# Altium footprint library IC_SMD_QUAD.PCBLIB: 78 footprints (part 3 of 5)
Each footprint in its own frame and in the unit in brackets; x right, y up, seen from the top. Pads: shape width x height; smd on the part's side, far side on the other; paste and mask are expansions set on the pad; w line width, h text height; cw(c..) or ccw(c..) is an arc to the next point about the centre after c.
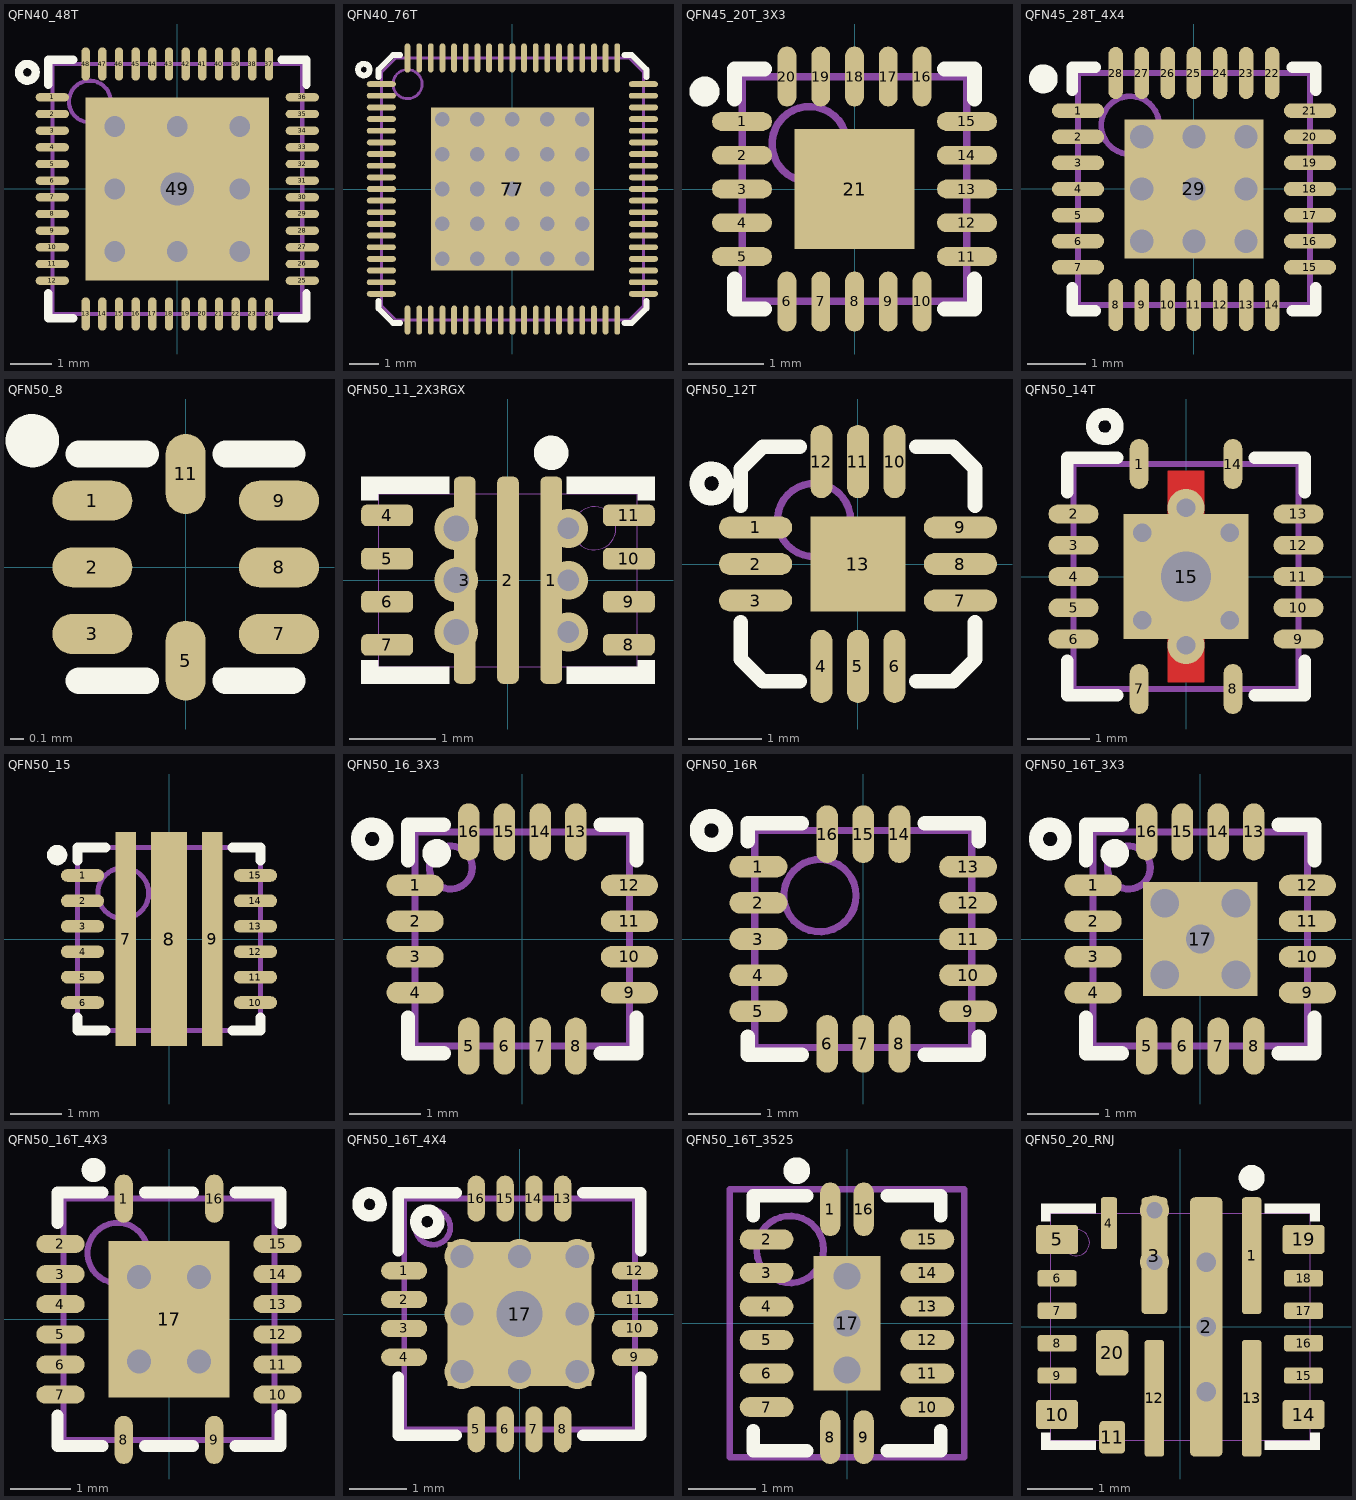
[diagram p2: the footprints below, top view; thin cyan lines are the x and y axes]

## QFN40_48T [mm] "QFN, 48-Leads, Body 6.00x6.00mm, Pitch 0.40mm, Thermal Pad 4.40x4.40mm"
height 1
pads (49):
  oval 0.8x0.2 smd mask+0.075: 1(-3,2.2) 2(-3,1.8) 3(-3,1.4) 4(-3,1) 5(-3,0.6) 6(-3,0.2) 7(-3,-0.2) 8(-3,-0.6) 9(-3,-1) 10(-3,-1.4) 11(-3,-1.8) 12(-3,-2.2) 25(3,-2.2) 26(3,-1.8) 27(3,-1.4) 28(3,-1) 29(3,-0.6) 30(3,-0.2) 31(3,0.2) 32(3,0.6) 33(3,1) 34(3,1.4) 35(3,1.8) 36(3,2.2)
  oval 0.2x0.8 smd mask+0.075: 13(-2.2,-3) 14(-1.8,-3) 15(-1.4,-3) 16(-1,-3) 17(-0.6,-3) 18(-0.2,-3) 19(0.2,-3) 20(0.6,-3) 21(1,-3) 22(1.4,-3) 23(1.8,-3) 24(2.2,-3) 37(2.2,3) 38(1.8,3) 39(1.4,3) 40(1,3) 41(0.6,3) 42(0.2,3) 43(-0.2,3) 44(-0.6,3) 45(-1,3) 46(-1.4,3) 47(-1.8,3) 48(-2.2,3)
  rect 4.4x4.4 smd mask+0.1: 49(0,0)
via 0,0 diameter 1.2 hole 0.8
via 0,1.5 diameter 0.8 hole 0.5
via -1.5,0 diameter 0.8 hole 0.5
via 0,-1.5 diameter 0.8 hole 0.5
via 1.5,0 diameter 0.8 hole 0.5
via 1.5,1.5 diameter 0.8 hole 0.5
via -1.5,1.5 diameter 0.8 hole 0.5
via -1.5,-1.5 diameter 0.8 hole 0.5
via 1.5,-1.5 diameter 0.8 hole 0.5
TopOverlay:
  circle w0.2: c-3.6,2.8 r0.2
  lines w0.2: -3.1,-2.5 -3.1,-3.1 -2.5,-3.1 ; -3.1,2.5 -3.1,3.1 -2.5,3.1 ; 2.5,-3.1 3.1,-3.1 3.1,-2.5 ; 2.5,3.1 3.1,3.1 3.1,2.5
Mechanical13:
  circle w0.1: c-2.1,2.1 r0.5
  lines w0.1: -3,-3 -3,3 3,3 3,-3 -3,-3
3D body: height 1, standoff 0, extent -3,-3 3,3

## QFN40_76T [mm] "QFN, 76-Leads, Body 9.00x9.00mm, Pitch 0.40mm, Thermal Pad 5.50x5.50mm"
height 1
pads (77):
  oval 1x0.2 smd mask+0.05: 1(-4.5,3.6) 2(-4.5,3.2) 3(-4.5,2.8) 4(-4.5,2.4) 5(-4.5,2) 6(-4.5,1.6) 7(-4.5,1.2) 8(-4.5,0.8) 9(-4.5,0.4) 10(-4.5,0) 11(-4.5,-0.4) 12(-4.5,-0.8) 13(-4.5,-1.2) 14(-4.5,-1.6) 15(-4.5,-2) 16(-4.5,-2.4) 17(-4.5,-2.8) 18(-4.5,-3.2) 19(-4.5,-3.6) 39(4.5,-3.6) 40(4.5,-3.2) 41(4.5,-2.8) 42(4.5,-2.4) 43(4.5,-2) 44(4.5,-1.6) 45(4.5,-1.2) 46(4.5,-0.8) 47(4.5,-0.4) 48(4.5,0) 49(4.5,0.4) 50(4.5,0.8) 51(4.5,1.2) 52(4.5,1.6) 53(4.5,2) 54(4.5,2.4) 55(4.5,2.8) 56(4.5,3.2) 57(4.5,3.6)
  oval 0.2x1 smd mask+0.05: 20(-3.6,-4.5) 21(-3.2,-4.5) 22(-2.8,-4.5) 23(-2.4,-4.5) 24(-2,-4.5) 25(-1.6,-4.5) 26(-1.2,-4.5) 27(-0.8,-4.5) 28(-0.4,-4.5) 29(0,-4.5) 30(0.4,-4.5) 31(0.8,-4.5) 32(1.2,-4.5) 33(1.6,-4.5) 34(2,-4.5) 35(2.4,-4.5) 36(2.8,-4.5) 37(3.2,-4.5) 38(3.6,-4.5) 58(3.6,4.5) 59(3.2,4.5) 60(2.8,4.5) 61(2.4,4.5) 62(2,4.5) 63(1.6,4.5) 64(1.2,4.5) 65(0.8,4.5) 66(0.4,4.5) 67(0,4.5) 68(-0.4,4.5) 69(-0.8,4.5) 70(-1.2,4.5) 71(-1.6,4.5) 72(-2,4.5) 73(-2.4,4.5) 74(-2.8,4.5) 75(-3.2,4.5) 76(-3.6,4.5)
  rect 5.6x5.6 smd: 77(0,0)
via -2.4,2.4 diameter 0.8 hole 0.5
via -1.2,2.4 diameter 0.8 hole 0.5
via -2.4,1.2 diameter 0.8 hole 0.5
via 0,2.4 diameter 0.8 hole 0.5
via 1.2,2.4 diameter 0.8 hole 0.5
via 2.4,2.4 diameter 0.8 hole 0.5
via -1.2,1.2 diameter 0.8 hole 0.5
via 0,1.2 diameter 0.8 hole 0.5
via 1.2,1.2 diameter 0.8 hole 0.5
via 2.4,1.2 diameter 0.8 hole 0.5
via -1.2,0 diameter 0.8 hole 0.5
via -1.2,-1.2 diameter 0.8 hole 0.5
via -2.4,0 diameter 0.8 hole 0.5
via -1.2,-2.4 diameter 0.8 hole 0.5
via -2.4,-1.2 diameter 0.8 hole 0.5
via -2.4,-2.4 diameter 0.8 hole 0.5
via 1.2,0 diameter 0.8 hole 0.5
via 1.2,-1.2 diameter 0.8 hole 0.5
via 0,0 diameter 0.8 hole 0.5
via 1.2,-2.4 diameter 0.8 hole 0.5
via 0,-1.2 diameter 0.8 hole 0.5
via 0,-2.4 diameter 0.8 hole 0.5
via 2.4,0 diameter 0.8 hole 0.5
via 2.4,-1.2 diameter 0.8 hole 0.5
via 2.4,-2.4 diameter 0.8 hole 0.5
TopOverlay:
  circle w0.2: c-5.1,4.1 r0.2
  lines w0.2: -4.6,-3.85 -4.6,-4.1 -4.1,-4.6 -3.85,-4.6 ; -4.6,3.85 -4.6,4.1 -4.1,4.6 -3.85,4.6 ; 3.85,-4.6 4.1,-4.6 4.6,-4.1 4.6,-3.85 ; 3.85,4.6 4.1,4.6 4.6,4.1 4.6,3.85
Mechanical13:
  circle w0.1: c-3.6,3.6 r0.5
  lines w0.1: -4.5,-4 -4,-4.5 4,-4.5 4.5,-4 4.5,4 4,4.5 -4,4.5 -4.5,4 -4.5,-4
3D body: height 1, standoff 0, extent -4.5,-4.5 4.5,4.5

## QFN45_20T_3X3 [mm] "20M2, QFN-20, 3X3mm, pitch 0.45mm"
height 0.8
pads (21):
  oval 0.8x0.25 smd mask+0.05: 1(-1.5,0.9) 2(-1.5,0.45) 3(-1.5,0) 4(-1.5,-0.45) 5(-1.5,-0.9) 11(1.5,-0.9) 12(1.5,-0.45) 13(1.5,0) 14(1.5,0.45) 15(1.5,0.9)
  oval 0.25x0.8 smd mask+0.05: 6(-0.9,-1.5) 7(-0.45,-1.5) 8(0,-1.5) 9(0.45,-1.5) 10(0.9,-1.5) 16(0.9,1.5) 17(0.45,1.5) 18(0,1.5) 19(-0.45,1.5) 20(-0.9,1.5)
  rect 1.6x1.6 smd mask+0.1: 21(0,0)
TopOverlay:
  circle w0.2: c-2,1.3 r0.1
  lines w0.2: -1.6,-1.2 -1.6,-1.6 -1.2,-1.6 ; -1.6,1.2 -1.6,1.6 -1.2,1.6 ; 1.2,-1.6 1.6,-1.6 1.6,-1.2 ; 1.2,1.6 1.6,1.6 1.6,1.2
Mechanical13:
  circle w0.1: c-0.6,0.6 r0.5
  lines w0.1: -1.5,-1.5 1.5,-1.5 1.5,1.5 -1.5,1.5 -1.5,-1.5
3D body "QFN45_20T_3X3.step": height 0.8, standoff 0, extent -1.501,-1.501 1.501,1.501

## QFN45_28T_4X4 [mm] "28M1, QFN-28, pitch:0.45mm 4x4x1mm"
height 1
pads (29):
  oval 0.9x0.25 smd mask+0.05: 1(-2,1.35) 2(-2,0.9) 3(-2,0.45) 4(-2,0) 5(-2,-0.45) 6(-2,-0.9) 7(-2,-1.35) 15(2,-1.35) 16(2,-0.9) 17(2,-0.45) 18(2,0) 19(2,0.45) 20(2,0.9) 21(2,1.35)
  oval 0.25x0.9 smd mask+0.05: 8(-1.35,-2) 9(-0.9,-2) 10(-0.45,-2) 11(0,-2) 12(0.45,-2) 13(0.9,-2) 14(1.35,-2) 22(1.35,2) 23(0.9,2) 24(0.45,2) 25(0,2) 26(-0.45,2) 27(-0.9,2) 28(-1.35,2)
  rect 2.4x2.4 smd: 29(0,0)
via 0,0 diameter 0.6 hole 0.4
via 0,0.9 diameter 0.6 hole 0.4
via 0,-0.9 diameter 0.6 hole 0.4
via 0.9,0 diameter 0.6 hole 0.4
via -0.9,0 diameter 0.6 hole 0.4
via -0.9,0.9 diameter 0.6 hole 0.4
via 0.9,0.9 diameter 0.6 hole 0.4
via -0.9,-0.9 diameter 0.6 hole 0.4
via 0.9,-0.9 diameter 0.6 hole 0.4
TopOverlay:
  circle w0.25: c-2.6,1.9 r0.125
  lines w0.2: -2.1,-1.7 -2.1,-2.1 -1.7,-2.1 ; -2.1,1.7 -2.1,2.1 -1.7,2.1 ; 1.7,-2.1 2.1,-2.1 2.1,-1.7 ; 1.7,2.1 2.1,2.1 2.1,1.7
Mechanical13:
  circle w0.1: c-1.1,1.1 r0.5
  lines w0.1: -2,-2 -2,2 2,2 2,-2 -2,-2
3D body "QFN45_28T_4X4.step": height 1, standoff 0, extent -2.001,-2.001 2.001,2.001

## QFN50_8 [mm] "RSE UQFN-8, 1.5X1.5X.6mm"
height 0.6
pads (8):
  oval 0.6x0.3 smd mask+0.05: 1(-0.7,0.5) 2(-0.7,0) 3(-0.7,-0.5) 7(0.7,-0.5) 8(0.7,0) 9(0.7,0.5)
  oval 0.3x0.6 smd mask+0.05: 5(0,-0.7) 11(0,0.7)
TopOverlay:
  circle w0.2: c-1.15,0.95 r0.1
  lines w0.2: -0.8,-0.85 -0.3,-0.85 ; -0.8,0.85 -0.3,0.85 ; 0.3,-0.85 0.8,-0.85 ; 0.3,0.85 0.8,0.85
3D body: height 0.6, standoff 0, extent -0.75,-0.75 0.75,0.75

## QFN50_11_2X3RGX [mm] "QFN-11 RGX, pitch: 0.5mm, 2x3x1mm"
height 1
pads (11):
  rrect50% 0.25x2.4 smd mask+0.05: 1(0.5,0) 2(0,0) 3(-0.5,0)
  rrect50% 0.6x0.25 smd mask+0.05: 4(-1.4,0.75) 5(-1.4,0.25) 6(-1.4,-0.25) 7(-1.4,-0.75) 8(1.4,-0.75) 9(1.4,-0.25) 10(1.4,0.25) 11(1.4,0.75)
via -0.6,0 diameter 0.5 hole 0.3
via -0.6,0.6 diameter 0.5 hole 0.3
via -0.6,-0.6 diameter 0.5 hole 0.3
via 0.7,-0.6 diameter 0.45 hole 0.25
via 0.7,0.6 diameter 0.45 hole 0.25
via 0.7,0 diameter 0.45 hole 0.25
TopOverlay:
  circle w0.2: c0.5,1.475 r0.1
  rectangle: 0.675,-1.2 1.7,-1
  region: 1.5,-0.925 1.5,-1.2 1.7,-1.2 1.7,-0.925
  region: -0.675,-1 -1.7,-1 -1.7,-1.2 -0.675,-1.2
  region: -1.7,-0.925 -1.7,-1.2 -1.5,-1.2 -1.5,-0.925
  region: -0.675,1.2 -1.7,1.2 -1.7,1 -0.675,1
  region: -1.5,0.925 -1.5,1.2 -1.7,1.2 -1.7,0.925
  region: 1.7,0.925 1.7,1.2 1.5,1.2 1.5,0.925
  rectangle: 0.675,1 1.7,1.2
TopPaste:
  drawing of 9 lines, arcs and shapes, not listed
Mechanical13:
  circle w0.01: c1,0.6 r0.25
  lines w0.01: -1.5,-1 -1.5,1 1.5,1 1.5,-1 -1.5,-1
3D body "RGX0011A.stp": height 1, standoff 0, extent -1.5,-1 1.5,1

## QFN50_12T [mm] "LFCSP, CP-12-4, 3X3mm, 0.5mm pitch, MO-220"
height 0.8
pads (13):
  oval 1x0.3 smd mask+0.05: 1(-1.4,0.5) 2(-1.4,0) 3(-1.4,-0.5) 7(1.4,-0.5) 8(1.4,0) 9(1.4,0.5)
  oval 0.3x1 smd mask+0.05: 4(-0.5,-1.4) 5(0,-1.4) 6(0.5,-1.4) 10(0.5,1.4) 11(0,1.4) 12(-0.5,1.4)
  rect 1.3x1.3 smd mask+0.075: 13(0,0)
TopOverlay:
  circle w0.2: c-2,1.1 r0.2
  lines w0.2: -1.6,-0.8 -1.6,-1.3 -1.3,-1.6 -0.8,-1.6 ; -1.6,0.8 -1.6,1.3 -1.3,1.6 -0.8,1.6 ; 0.8,-1.6 1.3,-1.6 1.6,-1.3 1.6,-0.8 ; 0.8,1.6 1.3,1.6 1.6,1.3 1.6,0.8
Mechanical13:
  circle w0.1: c-0.6,0.6 r0.5
3D body "User Library-LFCSP.STEP": height 0.85, standoff 0, extent -1.525,-1.525 1.525,1.525

## QFN50_14T [mm] "S-PVQFN-N14, 3.5X3.5mm, pitch: 0.5mm, 6+2+6+2"
pads (15):
  oval 0.3x0.8 smd mask+0.075: 1(-0.75,1.8) 7(-0.75,-1.8) 8(0.75,-1.8) 14(0.75,1.8)
  oval 0.8x0.3 smd mask+0.075: 2(-1.8,1) 3(-1.8,0.5) 4(-1.8,0) 5(-1.8,-0.5) 6(-1.8,-1) 9(1.8,-1) 10(1.8,-0.5) 11(1.8,0) 12(1.8,0.5) 13(1.8,1)
  rect 2x2 smd mask+0.1: 15(0,0)
via 0,0 diameter 1.2 hole 0.8
via -0.7,0.7 diameter 0.6 hole 0.3
via 0.7,0.7 diameter 0.6 hole 0.3
via 0.7,-0.7 diameter 0.6 hole 0.3
via -0.7,-0.7 diameter 0.6 hole 0.3
via 0,-1.1 diameter 0.6 hole 0.3
via 0,1.1 diameter 0.6 hole 0.3
TopLayer:
  rectangle: -0.3,-1.7 0.3,1.7
TopOverlay:
  circle w0.2: c-1.3,2.4 r0.2
  lines w0.2: -1.9,-1.35 -1.9,-1.9 -1.1,-1.9 ; -1.9,1.35 -1.9,1.9 -1.1,1.9 ; 1.1,-1.9 1.9,-1.9 1.9,-1.35 ; 1.1,1.9 1.9,1.9 1.9,1.35
TopSolder:
  rectangle: -0.4,-1.8 0.4,1.8
Mechanical13:
  lines w0.1: -1.8,-1.8 1.8,-1.8 1.8,1.8 -1.8,1.8 -1.8,-1.8
3D body: height 1, standoff 0, extent -1.8,-1.8 1.8,1.8

## QFN50_15 [mm] "PVQFN-N15"
pads (15):
  oval 0.85x0.25 smd mask+0.075: 1(-1.7,1.25) 2(-1.7,0.75) 3(-1.7,0.25) 4(-1.7,-0.25) 5(-1.7,-0.75) 6(-1.7,-1.25) 10(1.7,-1.25) 11(1.7,-0.75) 12(1.7,-0.25) 13(1.7,0.25) 14(1.7,0.75) 15(1.7,1.25)
  rect 0.4x4.2 smd paste-1.8 mask+0.075: 7(-0.85,0) 9(0.85,0)
  rect 0.7x4.2 smd paste-1.8 mask+0.075: 8(0,0)
TopOverlay:
  circle w0.2: c-2.2,1.65 r0.1
  lines w0.2: -1.8,-1.55 -1.8,-1.8 -1.25,-1.8 ; -1.8,1.55 -1.8,1.8 -1.25,1.8 ; 1.25,-1.8 1.8,-1.8 1.8,-1.55 ; 1.25,1.8 1.8,1.8 1.8,1.55
TopPaste:
  rectangle: -1.05,1.3 -0.65,2.1
  rectangle: -1.05,-2.1 -0.65,-1.3
  rectangle: -1.05,0.2 -0.65,1
  rectangle: -1.05,-1 -0.65,-0.2
  region: 1.05,-0.2 0.65,-0.2 0.65,-1 1.05,-1
  region: 1.05,1 0.65,1 0.65,0.2 1.05,0.2
  region: 1.05,-1.3 0.65,-1.3 0.65,-2.1 1.05,-2.1
  region: 1.05,2.1 0.65,2.1 0.65,1.3 1.05,1.3
  rectangle: -0.3,-1 0.3,-0.2
  rectangle: -0.3,0.2 0.3,1
  rectangle: -0.3,-2.1 0.3,-1.3
  rectangle: -0.3,1.3 0.3,2.1
Mechanical13:
  circle w0.1: c-0.9,0.9 r0.5
  lines w0.1: -1.8,-1.8 -1.8,1.8 1.8,1.8 1.8,-1.8 -1.8,-1.8
3D body "QFN50_155.step": height 1.03, standoff 0.02, extent -1.801,-1.8 1.801,1.8

## QFN50_16_3X3 [mm] "LPCC, RGT, 16-lead, pitch: 0.5mm, 3x3mm"
height 1
pads (16):
  oval 0.8x0.3 smd mask+0.075: 1(-1.5,0.75) 2(-1.5,0.25) 3(-1.5,-0.25) 4(-1.5,-0.75) 9(1.5,-0.75) 10(1.5,-0.25) 11(1.5,0.25) 12(1.5,0.75)
  oval 0.3x0.8 smd mask+0.075: 5(-0.75,-1.5) 6(-0.25,-1.5) 7(0.25,-1.5) 8(0.75,-1.5) 13(0.75,1.5) 14(0.25,1.5) 15(-0.25,1.5) 16(-0.75,1.5)
TopOverlay:
  circle w0.2: c-2.1,1.4 r0.2
  circle w0.2: c-1.2,1.2 r0.1
  lines w0.2: -1.6,-1.1 -1.6,-1.6 -1.1,-1.6 ; -1.6,1.1 -1.6,1.6 -1.1,1.6 ; 1.1,-1.6 1.6,-1.6 1.6,-1.1 ; 1.1,1.6 1.6,1.6 1.6,1.1
Mechanical13:
  circle w0.1: c-1,1 r0.3
  lines w0.1: -1.5,-1.5 -1.5,1.5 1.5,1.5 1.5,-1.5 -1.5,-1.5
3D body: height 1, standoff 0, extent -1.5,-1.5 1.5,1.5

## QFN50_16R [mm] "MMA8451Q (FREESCALE) 5+3+5+3, 3X3mm, 0.5mm"
height 1
pads (16):
  oval 0.8x0.3 smd mask+0.075: 1(-1.45,1) 2(-1.45,0.5) 3(-1.45,0) 4(-1.45,-0.5) 5(-1.45,-1) 9(1.45,-1) 10(1.45,-0.5) 11(1.45,0) 12(1.45,0.5) 13(1.45,1)
  oval 0.3x0.8 smd mask+0.075: 6(-0.5,-1.45) 7(0,-1.45) 8(0.5,-1.45) 14(0.5,1.45) 15(0,1.45) 16(-0.5,1.45)
TopOverlay:
  circle w0.2: c-2.1,1.5 r0.2
  lines w0.2: -1.6,-1.35 -1.6,-1.6 -0.85,-1.6 ; -1.6,1.35 -1.6,1.6 -0.85,1.6 ; 0.85,-1.6 1.6,-1.6 1.6,-1.35 ; 0.85,1.6 1.6,1.6 1.6,1.35
Mechanical13:
  circle w0.1: c-0.6,0.6 r0.5
  lines w0.1: -1.5,-1.5 1.5,-1.5 1.5,1.5 -1.5,1.5 -1.5,-1.5
3D body: height 1, standoff 0, extent -1.5,-1.5 1.5,1.5

## QFN50_16T_3X3 [mm] "RGT PVQFN (TI), 16-lead, pitch: 0.5mm, 3x3mm"
height 1
pads (17):
  oval 0.8x0.3 smd mask+0.075: 1(-1.5,0.75) 2(-1.5,0.25) 3(-1.5,-0.25) 4(-1.5,-0.75) 9(1.5,-0.75) 10(1.5,-0.25) 11(1.5,0.25) 12(1.5,0.75)
  oval 0.3x0.8 smd mask+0.075: 5(-0.75,-1.5) 6(-0.25,-1.5) 7(0.25,-1.5) 8(0.75,-1.5) 13(0.75,1.5) 14(0.25,1.5) 15(-0.25,1.5) 16(-0.75,1.5)
  rect 1.6x1.6 smd mask+0.1: 17(0,0)
via 0.5,0.5 diameter 0.6 hole 0.4
via 0.5,-0.5 diameter 0.6 hole 0.4
via -0.5,-0.5 diameter 0.6 hole 0.4
via -0.5,0.5 diameter 0.6 hole 0.4
via 0,0 diameter 0.6 hole 0.4
TopOverlay:
  circle w0.2: c-2.1,1.4 r0.2
  circle w0.2: c-1.2,1.2 r0.1
  lines w0.2: -1.6,-1.1 -1.6,-1.6 -1.1,-1.6 ; -1.6,1.1 -1.6,1.6 -1.1,1.6 ; 1.1,-1.6 1.6,-1.6 1.6,-1.1 ; 1.1,1.6 1.6,1.6 1.6,1.1
Mechanical13:
  circle w0.1: c-1,1 r0.3
  lines w0.1: -1.5,-1.5 -1.5,1.5 1.5,1.5 1.5,-1.5 -1.5,-1.5
3D body "RGT0016C.stp": height 1, standoff 0, extent -1.5,-1.5 1.5,1.5

## QFN50_16T_4X3 [mm] "VQFN-16 RGY 4X3.5mm, 0.5mm pitch"
height 1
pads (17):
  oval 0.3x0.8 smd mask+0.05: 1(-0.75,2) 8(-0.75,-2) 9(0.75,-2) 16(0.75,2)
  oval 0.8x0.3 smd mask+0.05: 2(-1.8,1.25) 3(-1.8,0.75) 4(-1.8,0.25) 5(-1.8,-0.25) 6(-1.8,-0.75) 7(-1.8,-1.25) 10(1.8,-1.25) 11(1.8,-0.75) 12(1.8,-0.25) 13(1.8,0.25) 14(1.8,0.75) 15(1.8,1.25)
  rect 2x2.6 smd: 17(0,0)
via -0.5,0.7 diameter 0.6 hole 0.4
via 0.5,0.7 diameter 0.6 hole 0.4
via -0.5,-0.7 diameter 0.6 hole 0.4
via 0.5,-0.7 diameter 0.6 hole 0.4
TopOverlay:
  circle w0.2: c-1.25,2.475 r0.1
  lines w0.2: -1.85,-1.6 -1.85,-2.1 -1.1,-2.1 ; -1.85,1.6 -1.85,2.1 -1.1,2.1 ; -0.4,-2.1 0.4,-2.1 ; -0.4,2.1 0.4,2.1 ; 1.1,-2.1 1.85,-2.1 1.85,-1.6 ; 1.1,2.1 1.85,2.1 1.85,1.6
Mechanical13:
  circle w0.1: c-0.85,1.1 r0.5
  lines w0.1: -1.75,-2 1.75,-2 1.75,2 -1.75,2 -1.75,-2
3D body "QFN50_16T_400X350.step": height 1, standoff 0, extent -1.751,-2.001 1.751,2.001

## QFN50_16T_4X4 [mm] "QFN, 16, 4X4mm, 0.5mm"
height 1
pads (17):
  oval 0.8x0.3 smd mask+0.075: 1(-2,0.75) 2(-2,0.25) 3(-2,-0.25) 4(-2,-0.75) 9(2,-0.75) 10(2,-0.25) 11(2,0.25) 12(2,0.75)
  oval 0.3x0.8 smd mask+0.075: 5(-0.75,-2) 6(-0.25,-2) 7(0.25,-2) 8(0.75,-2) 13(0.75,2) 14(0.25,2) 15(-0.25,2) 16(-0.75,2)
  rect 2.5x2.5 smd mask+0.1: 17(0,0)
via 1,1 diameter 0.6 hole 0.4
via 1,0 diameter 0.6 hole 0.4
via 1,-1 diameter 0.6 hole 0.4
via 0,-1 diameter 0.6 hole 0.4
via -1,-1 diameter 0.6 hole 0.4
via -1,0 diameter 0.6 hole 0.4
via -1,1 diameter 0.6 hole 0.4
via 0,1 diameter 0.6 hole 0.4
via 0,0 diameter 1.2 hole 0.8
TopOverlay:
  circle w0.2: c-1.6,1.6 r0.2
  circle w0.2: c-2.6,1.9 r0.2
  lines w0.2: -2.1,-1.1 -2.1,-2.1 -1.1,-2.1 ; -2.1,1.1 -2.1,2.1 -1.1,2.1 ; 1.1,-2.1 2.1,-2.1 2.1,-1.1 ; 1.1,2.1 2.1,2.1 2.1,1.1
Mechanical13:
  circle w0.1: c-1.5,1.5 r0.3
  lines w0.1: -2,-2 -2,2 2,2 2,-2 -2,-2
3D body: height 1, standoff 0, extent -2,-2 2,2

## QFN50_16T_3525 [mm] "VQFN-16 RGY 3.5X2.5mm, 0.5mm pitch"
height 1
pads (17):
  oval 0.3x0.8 smd mask+0.05: 1(-0.25,1.7) 8(-0.25,-1.7) 9(0.25,-1.7) 16(0.25,1.7)
  oval 0.8x0.3 smd mask+0.05: 2(-1.2,1.25) 3(-1.2,0.75) 4(-1.2,0.25) 5(-1.2,-0.25) 6(-1.2,-0.75) 7(-1.2,-1.25) 10(1.2,-1.25) 11(1.2,-0.75) 12(1.2,-0.25) 13(1.2,0.25) 14(1.2,0.75) 15(1.2,1.25)
  rect 1x2 smd: 17(0,0)
via 0,0.7 diameter 0.6 hole 0.4
via 0,-0.7 diameter 0.6 hole 0.4
via 0,0 diameter 0.6 hole 0.4
TopOverlay:
  circle w0.2: c-0.75,2.275 r0.1
  lines w0.2: -1.4,-1.6 -1.4,-1.9 -0.6,-1.9 ; -1.4,1.6 -1.4,1.9 -0.6,1.9 ; 0.6,-1.9 1.4,-1.9 1.4,-1.6 ; 0.6,1.9 1.4,1.9 1.4,1.6
Mechanical13:
  circle w0.1: c-0.85,1.1 r0.5
  lines w0.1: -1.75,-2 1.75,-2 1.75,2 -1.75,2 -1.75,-2
3D body "User Library-User Library-DHVQFN 16.step": height 1, standoff -0.05, extent -1.31,-1.81 1.31,1.81

## QFN50_20_RNJ [mm] "VQFN RNJ, 20-Leads, Body 3.5x4mm, Pitch 0.50mm"
height 4.4
pads (20):
  rrect30% 0.3x1.8 smd mask+0.05: 1(1.1,1.1) 12(-0.4,-1.1) 13(1.1,-1.1)
  rrect30% 0.5x4 smd mask+0.05: 2(0.4,0)
  rrect30% 0.4x1.8 smd mask+0.05: 3(-0.4,1.1)
  rrect30% 0.25x0.8 smd mask+0.05: 4(-1.1,1.6)
  rrect25% 0.65x0.45 smd mask+0.05: 5(-1.9,1.35) 10(-1.9,-1.35) 14(1.9,-1.35) 19(1.9,1.35)
  rrect30% 0.6x0.25 smd mask+0.05: 6(-1.9,0.75) 7(-1.9,0.25) 8(-1.9,-0.25) 9(-1.9,-0.75) 15(1.9,-0.75) 16(1.9,-0.25) 17(1.9,0.25) 18(1.9,0.75)
  rrect30% 0.4x0.5 smd mask+0.05: 11(-1.05,-1.7)
  rrect30% 0.5x0.7 smd mask+0.05: 20(-1.05,-0.4)
via -0.4,1.8 diameter 0.45 hole 0.25
via -0.4,1 diameter 0.45 hole 0.25
via 0.4,1 diameter 0.5 hole 0.3
via 0.4,0 diameter 0.5 hole 0.3
via 0.4,-1 diameter 0.5 hole 0.3
TopOverlay:
  circle w0.2: c1.1,2.3 r0.1
  rectangle: 1.3,1.75 2.15,1.9
  rectangle: 2,1.625 2.15,1.9
  region: -2,1.9 -2.15,1.9 -2.15,1.625 -2,1.625
  region: -1.3,1.9 -2.15,1.9 -2.15,1.75 -1.3,1.75
  region: -2,-1.625 -2.15,-1.625 -2.15,-1.9 -2,-1.9
  region: -1.3,-1.75 -2.15,-1.75 -2.15,-1.9 -1.3,-1.9
  rectangle: 2,-1.9 2.15,-1.625
  rectangle: 1.3,-1.9 2.15,-1.75
Mechanical13:
  circle w0.01: c-1.6,1.3 r0.2
  lines w0.01: -2,-1.75 2,-1.75 2,1.75 -2,1.75 -2,-1.75
3D body "RNJ0020A.stp": height 1, standoff 0, extent -2,-1.75 2,1.75